# Altium integrated library Weidmueller_OMNIMATE_Power.IntLib: 508 symbols (part 4 of 9)
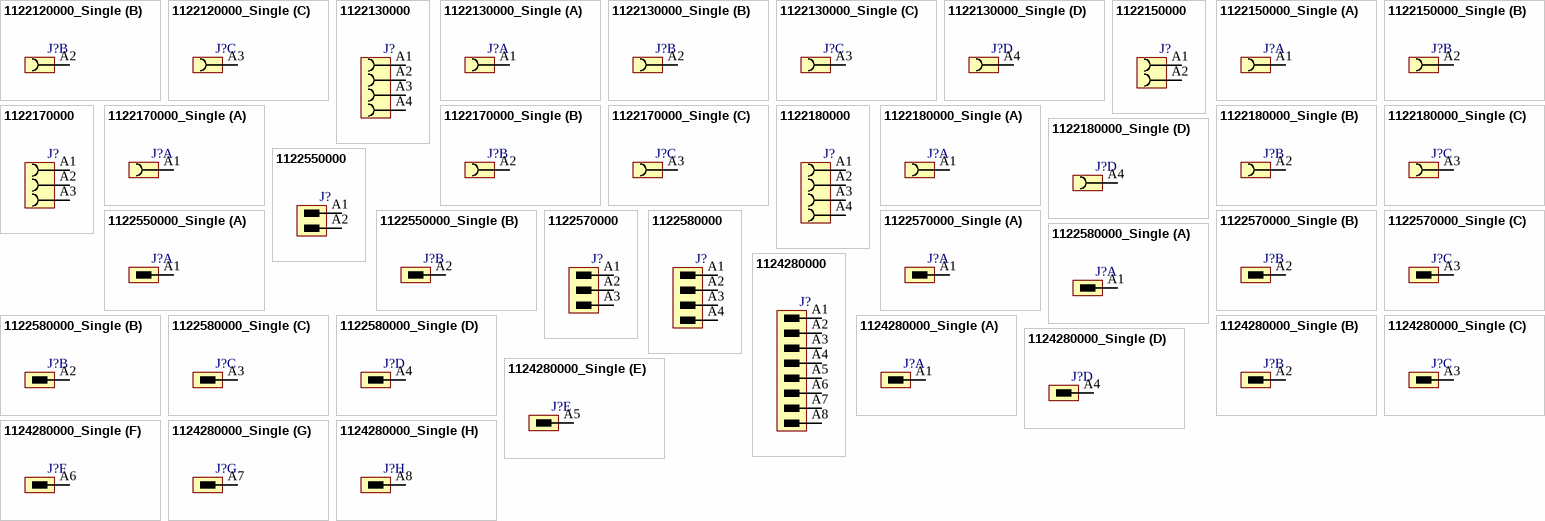
[diagram p34: symbols 1122120000_Single to 1124280000_Single]

## 1122550000
designator J?
OMNIMATE Power - series BL/SL 7.62HP; PartNumber: 1122550000; Manufacturer: Weidmueller; Short_text_for_material: SL 7.62HP/02/180G 3.2SN BK BX; Side_termination_characteristic: closed side; Mounting_onto_the_PCB: Solder connection; Pitch_mm: 7.62 mm; Pitch_inch: 0.3 inch; No_of_poles: 2; Outgoing_elbow: 180°; Solder_pin_length_mm: 3.2 mm; Contact_material: Cu-Leg; Contact_surface: tinned; Insulating_material: PBT; UL_94_flammability_rating: V-0; Rated_voltage_for_surge_voltage_class_pollution_degree_II_2: 630 V; Rated_voltage_use_group_B_UL_1059: 300 V; Rated_current_use_group_B_UL_1059: 20 A; PackageReference: SL_7_62HP_180G_02; Colour: Black; Packaging: Box; Qty: 100 PCS; Revision: V1; ComponentLink1Description: Manufacturer URL; ComponentLink1URL: http://www.weidmueller.com/; ComponentLink2Description: URL Link1; ComponentLink2URL: http://catalog.weidmueller.com/catalog/Start.do?localeId=en&ObjectID=1122550000
footprint SL_7_62HP_180G_02 (OMNIMATE Power - Serie BL/SL 7.62HP  SL 7.62HP/02/180G 3.2)
pins: A1, A2

## 1122550000_Single
designator J?
OMNIMATE Power - series BL/SL 7.62HP; PartNumber: 1122550000; Manufacturer: Weidmueller; Short_text_for_material: SL 7.62HP/02/180G 3.2SN BK BX; Side_termination_characteristic: closed side; Mounting_onto_the_PCB: Solder connection; Pitch_mm: 7.62 mm; Pitch_inch: 0.3 inch; No_of_poles: 2; Outgoing_elbow: 180°; Solder_pin_length_mm: 3.2 mm; Contact_material: Cu-Leg; Contact_surface: tinned; Insulating_material: PBT; UL_94_flammability_rating: V-0; Rated_voltage_for_surge_voltage_class_pollution_degree_II_2: 630 V; Rated_voltage_use_group_B_UL_1059: 300 V; Rated_current_use_group_B_UL_1059: 20 A; PackageReference: SL_7_62HP_180G_02; Colour: Black; Packaging: Box; Qty: 100 PCS; Revision: V1; ComponentLink1Description: Manufacturer URL; ComponentLink1URL: http://www.weidmueller.com/; ComponentLink2Description: URL Link1; ComponentLink2URL: http://catalog.weidmueller.com/catalog/Start.do?localeId=en&ObjectID=1122550000
footprint SL_7_62HP_180G_02 (OMNIMATE Power - Serie BL/SL 7.62HP  SL 7.62HP/02/180G 3.2)
part A pins: A1
part B pins: A2

## 1122570000
designator J?
OMNIMATE Power - series BL/SL 7.62HP; PartNumber: 1122570000; Manufacturer: Weidmueller; Short_text_for_material: SL 7.62HP/03/180G 3.2SN BK BX; Side_termination_characteristic: closed side; Mounting_onto_the_PCB: Solder connection; Pitch_mm: 7.62 mm; Pitch_inch: 0.3 inch; No_of_poles: 3; Outgoing_elbow: 180°; Solder_pin_length_mm: 3.2 mm; Contact_material: Cu-Leg; Contact_surface: tinned; Insulating_material: PBT; UL_94_flammability_rating: V-0; Rated_voltage_for_surge_voltage_class_pollution_degree_II_2: 630 V; Rated_voltage_use_group_B_UL_1059: 300 V; Rated_current_use_group_B_UL_1059: 20 A; PackageReference: SL_7_62HP_180G_03; Colour: Black; Packaging: Box; Qty: 100 PCS; Revision: V1; ComponentLink1Description: Manufacturer URL; ComponentLink1URL: http://www.weidmueller.com/; ComponentLink2Description: URL Link1; ComponentLink2URL: http://catalog.weidmueller.com/catalog/Start.do?localeId=en&ObjectID=1122570000
footprint SL_7_62HP_180G_03 (OMNIMATE Power - Serie BL/SL 7.62HP  SL 7.62HP/03/180G 3.2)
pins: A1, A2, A3

## 1122570000_Single
designator J?
OMNIMATE Power - series BL/SL 7.62HP; PartNumber: 1122570000; Manufacturer: Weidmueller; Short_text_for_material: SL 7.62HP/03/180G 3.2SN BK BX; Side_termination_characteristic: closed side; Mounting_onto_the_PCB: Solder connection; Pitch_mm: 7.62 mm; Pitch_inch: 0.3 inch; No_of_poles: 3; Outgoing_elbow: 180°; Solder_pin_length_mm: 3.2 mm; Contact_material: Cu-Leg; Contact_surface: tinned; Insulating_material: PBT; UL_94_flammability_rating: V-0; Rated_voltage_for_surge_voltage_class_pollution_degree_II_2: 630 V; Rated_voltage_use_group_B_UL_1059: 300 V; Rated_current_use_group_B_UL_1059: 20 A; PackageReference: SL_7_62HP_180G_03; Colour: Black; Packaging: Box; Qty: 100 PCS; Revision: V1; ComponentLink1Description: Manufacturer URL; ComponentLink1URL: http://www.weidmueller.com/; ComponentLink2Description: URL Link1; ComponentLink2URL: http://catalog.weidmueller.com/catalog/Start.do?localeId=en&ObjectID=1122570000
footprint SL_7_62HP_180G_03 (OMNIMATE Power - Serie BL/SL 7.62HP  SL 7.62HP/03/180G 3.2)
part A pins: A1
part B pins: A2
part C pins: A3

## 1122580000
designator J?
OMNIMATE Power - series BL/SL 7.62HP; PartNumber: 1122580000; Manufacturer: Weidmueller; Short_text_for_material: SL 7.62HP/04/180G 3.2SN BK BX; Side_termination_characteristic: closed side; Mounting_onto_the_PCB: Solder connection; Pitch_mm: 7.62 mm; Pitch_inch: 0.3 inch; No_of_poles: 4; Outgoing_elbow: 180°; Solder_pin_length_mm: 3.2 mm; Contact_material: Cu-Leg; Contact_surface: tinned; Insulating_material: PBT; UL_94_flammability_rating: V-0; Rated_voltage_for_surge_voltage_class_pollution_degree_II_2: 630 V; Rated_voltage_use_group_B_UL_1059: 300 V; Rated_current_use_group_B_UL_1059: 20 A; PackageReference: SL_7_62HP_180G_04; Colour: Black; Packaging: Box; Qty: 100 PCS; Revision: V1; ComponentLink1Description: Manufacturer URL; ComponentLink1URL: http://www.weidmueller.com/; ComponentLink2Description: URL Link1; ComponentLink2URL: http://catalog.weidmueller.com/catalog/Start.do?localeId=en&ObjectID=1122580000
footprint SL_7_62HP_180G_04 (OMNIMATE Power - Serie BL/SL 7.62HP  SL 7.62HP/04/180G 3.2)
pins: A1, A2, A3, A4

## 1122580000_Single
designator J?
OMNIMATE Power - series BL/SL 7.62HP; PartNumber: 1122580000; Manufacturer: Weidmueller; Short_text_for_material: SL 7.62HP/04/180G 3.2SN BK BX; Side_termination_characteristic: closed side; Mounting_onto_the_PCB: Solder connection; Pitch_mm: 7.62 mm; Pitch_inch: 0.3 inch; No_of_poles: 4; Outgoing_elbow: 180°; Solder_pin_length_mm: 3.2 mm; Contact_material: Cu-Leg; Contact_surface: tinned; Insulating_material: PBT; UL_94_flammability_rating: V-0; Rated_voltage_for_surge_voltage_class_pollution_degree_II_2: 630 V; Rated_voltage_use_group_B_UL_1059: 300 V; Rated_current_use_group_B_UL_1059: 20 A; PackageReference: SL_7_62HP_180G_04; Colour: Black; Packaging: Box; Qty: 100 PCS; Revision: V1; ComponentLink1Description: Manufacturer URL; ComponentLink1URL: http://www.weidmueller.com/; ComponentLink2Description: URL Link1; ComponentLink2URL: http://catalog.weidmueller.com/catalog/Start.do?localeId=en&ObjectID=1122580000
footprint SL_7_62HP_180G_04 (OMNIMATE Power - Serie BL/SL 7.62HP  SL 7.62HP/04/180G 3.2)
part A pins: A1
part B pins: A2
part C pins: A3
part D pins: A4

## 1124280000
designator J?
OMNIMATE Power - series BL/SL 7.62HP; PartNumber: 1124280000; Manufacturer: Weidmueller; Short_text_for_material: SL 7.62HP/08/90F 3.2 SN BK BX; Side_termination_characteristic: Flange; Mounting_onto_the_PCB: Solder connection; Pitch_mm: 7.62 mm; Pitch_inch: 0.3 inch; No_of_poles: 8; Outgoing_elbow: 90°; Solder_pin_length_mm: 3.2 mm; Contact_material: Cu-Leg; Contact_surface: tinned; Insulating_material: PBT; UL_94_flammability_rating: V-0; Rated_voltage_for_surge_voltage_class_pollution_degree_II_2: 630 V; Rated_voltage_use_group_B_UL_1059: 300 V; Rated_current_use_group_B_UL_1059: 20 A; PackageReference: SL_7_62HP_90F_08; Colour: Black; Packaging: Box; Qty: 50 PCS; Revision: V1; ComponentLink1Description: Manufacturer URL; ComponentLink1URL: http://www.weidmueller.com/; ComponentLink2Description: URL Link1; ComponentLink2URL: http://catalog.weidmueller.com/catalog/Start.do?localeId=en&ObjectID=1124280000
footprint SL_7_62HP_90F_08 (OMNIMATE Power - Serie BL/SL 7.62HP  SL 7.62HP/08/90F 3.2)
pins: A1, A2, A3, A4, A5, A6, A7, A8

## 1124280000_Single
designator J?
OMNIMATE Power - series BL/SL 7.62HP; PartNumber: 1124280000; Manufacturer: Weidmueller; Short_text_for_material: SL 7.62HP/08/90F 3.2 SN BK BX; Side_termination_characteristic: Flange; Mounting_onto_the_PCB: Solder connection; Pitch_mm: 7.62 mm; Pitch_inch: 0.3 inch; No_of_poles: 8; Outgoing_elbow: 90°; Solder_pin_length_mm: 3.2 mm; Contact_material: Cu-Leg; Contact_surface: tinned; Insulating_material: PBT; UL_94_flammability_rating: V-0; Rated_voltage_for_surge_voltage_class_pollution_degree_II_2: 630 V; Rated_voltage_use_group_B_UL_1059: 300 V; Rated_current_use_group_B_UL_1059: 20 A; PackageReference: SL_7_62HP_90F_08; Colour: Black; Packaging: Box; Qty: 50 PCS; Revision: V1; ComponentLink1Description: Manufacturer URL; ComponentLink1URL: http://www.weidmueller.com/; ComponentLink2Description: URL Link1; ComponentLink2URL: http://catalog.weidmueller.com/catalog/Start.do?localeId=en&ObjectID=1124280000
footprint SL_7_62HP_90F_08 (OMNIMATE Power - Serie BL/SL 7.62HP  SL 7.62HP/08/90F 3.2)
part A pins: A1
part B pins: A2
part C pins: A3
part D pins: A4
part E pins: A5
part F pins: A6
part G pins: A7
part H pins: A8

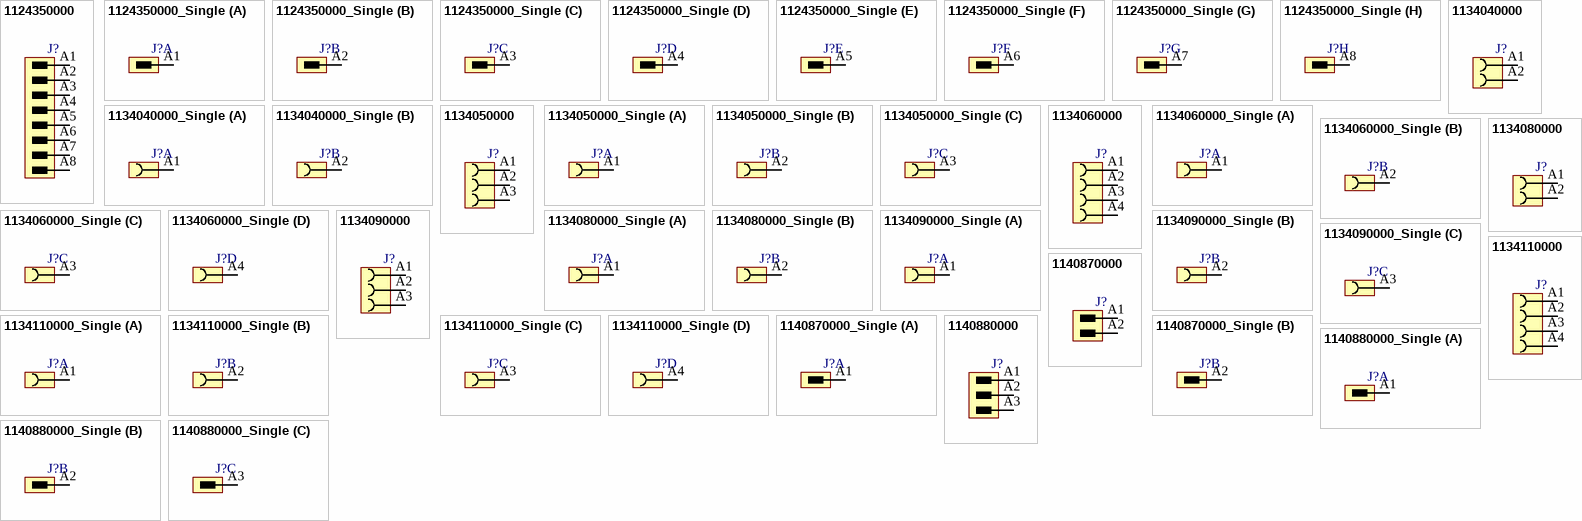
[diagram p11: symbols 1124350000 to 1140880000_Single]

## 1124350000
designator J?
OMNIMATE Power - series BL/SL 7.62HP; PartNumber: 1124350000; Manufacturer: Weidmueller; Short_text_for_material: SL 7.62HP/08/90F 3.2 SN OR BX; Side_termination_characteristic: Flange; Mounting_onto_the_PCB: Solder connection; Pitch_mm: 7.62 mm; Pitch_inch: 0.3 inch; No_of_poles: 8; Outgoing_elbow: 90°; Solder_pin_length_mm: 3.2 mm; Contact_surface: tinned; Insulating_material: PBT; UL_94_flammability_rating: V-0; Rated_voltage_for_surge_voltage_class_pollution_degree_II_2: 630 V; Rated_current_min_no_of_poles_TU_20_deg_C: 29 A; Rated_voltage_use_group_B_UL_1059: 300 V; Rated_current_use_group_B_UL_1059: 20 A; PackageReference: SL_7_62HP_90F_08; Colour: Orange; Packaging: Box; Qty: 50 PCS; Revision: V1; ComponentLink1Description: Manufacturer URL; ComponentLink1URL: http://www.weidmueller.com/; ComponentLink2Description: URL Link1; ComponentLink2URL: http://catalog.weidmueller.com/catalog/Start.do?localeId=en&ObjectID=1124350000
footprint SL_7_62HP_90F_08 (OMNIMATE Power - Serie BL/SL 7.62HP  SL 7.62HP/08/90F 3.2)
pins: A1, A2, A3, A4, A5, A6, A7, A8

## 1124350000_Single
designator J?
OMNIMATE Power - series BL/SL 7.62HP; PartNumber: 1124350000; Manufacturer: Weidmueller; Short_text_for_material: SL 7.62HP/08/90F 3.2 SN OR BX; Side_termination_characteristic: Flange; Mounting_onto_the_PCB: Solder connection; Pitch_mm: 7.62 mm; Pitch_inch: 0.3 inch; No_of_poles: 8; Outgoing_elbow: 90°; Solder_pin_length_mm: 3.2 mm; Contact_surface: tinned; Insulating_material: PBT; UL_94_flammability_rating: V-0; Rated_voltage_for_surge_voltage_class_pollution_degree_II_2: 630 V; Rated_current_min_no_of_poles_TU_20_deg_C: 29 A; Rated_voltage_use_group_B_UL_1059: 300 V; Rated_current_use_group_B_UL_1059: 20 A; PackageReference: SL_7_62HP_90F_08; Colour: Orange; Packaging: Box; Qty: 50 PCS; Revision: V1; ComponentLink1Description: Manufacturer URL; ComponentLink1URL: http://www.weidmueller.com/; ComponentLink2Description: URL Link1; ComponentLink2URL: http://catalog.weidmueller.com/catalog/Start.do?localeId=en&ObjectID=1124350000
footprint SL_7_62HP_90F_08 (OMNIMATE Power - Serie BL/SL 7.62HP  SL 7.62HP/08/90F 3.2)
part A pins: A1
part B pins: A2
part C pins: A3
part D pins: A4
part E pins: A5
part F pins: A6
part G pins: A7
part H pins: A8

## 1134040000
designator J?
OMNIMATE Power - series BL/SL 7.62HP; PartNumber: 1134040000; Manufacturer: Weidmueller; Short_text_for_material: BLL 7.62HP/02/180LF SN OR BX; Side_termination_characteristic: Solder flange; Mounting_onto_the_PCB: Solder connection; Pitch_mm: 7.62 mm; Pitch_inch: 0.3 inch; No_of_poles: 2; Outgoing_elbow: 180°; Solder_pin_length_mm: 3.2 mm; Contact_surface: tinned; Insulating_material: PA GF; UL_94_flammability_rating: V-0; Rated_voltage_for_surge_voltage_class_pollution_degree_II_2: 630 V; Rated_current_min_no_of_poles_TU_20_deg_C: 24 A; Rated_voltage_use_group_B_UL_1059: 300 V; Rated_current_use_group_B_UL_1059: 20 A; PackageReference: BLL_7_62HP_180LF_02; Colour: Orange; Packaging: Box; Qty: 72 PCS; Revision: V1; ComponentLink1Description: Manufacturer URL; ComponentLink1URL: http://www.weidmueller.com/; ComponentLink2Description: URL Link1; ComponentLink2URL: http://catalog.weidmueller.com/catalog/Start.do?localeId=en&ObjectID=1134040000
footprint BLL_7_62HP_180LF_02 (OMNIMATE Power - Serie BL/SL 7.62HP  BLL 7.62HP/02/180)
pins: A1, A2

## 1134040000_Single
designator J?
OMNIMATE Power - series BL/SL 7.62HP; PartNumber: 1134040000; Manufacturer: Weidmueller; Short_text_for_material: BLL 7.62HP/02/180LF SN OR BX; Side_termination_characteristic: Solder flange; Mounting_onto_the_PCB: Solder connection; Pitch_mm: 7.62 mm; Pitch_inch: 0.3 inch; No_of_poles: 2; Outgoing_elbow: 180°; Solder_pin_length_mm: 3.2 mm; Contact_surface: tinned; Insulating_material: PA GF; UL_94_flammability_rating: V-0; Rated_voltage_for_surge_voltage_class_pollution_degree_II_2: 630 V; Rated_current_min_no_of_poles_TU_20_deg_C: 24 A; Rated_voltage_use_group_B_UL_1059: 300 V; Rated_current_use_group_B_UL_1059: 20 A; PackageReference: BLL_7_62HP_180LF_02; Colour: Orange; Packaging: Box; Qty: 72 PCS; Revision: V1; ComponentLink1Description: Manufacturer URL; ComponentLink1URL: http://www.weidmueller.com/; ComponentLink2Description: URL Link1; ComponentLink2URL: http://catalog.weidmueller.com/catalog/Start.do?localeId=en&ObjectID=1134040000
footprint BLL_7_62HP_180LF_02 (OMNIMATE Power - Serie BL/SL 7.62HP  BLL 7.62HP/02/180)
part A pins: A1
part B pins: A2

## 1134050000
designator J?
OMNIMATE Power - series BL/SL 7.62HP; PartNumber: 1134050000; Manufacturer: Weidmueller; Short_text_for_material: BLL 7.62HP/03/180LF SN OR BX; Side_termination_characteristic: Solder flange; Mounting_onto_the_PCB: Solder connection; Pitch_mm: 7.62 mm; Pitch_inch: 0.3 inch; No_of_poles: 3; Outgoing_elbow: 180°; Solder_pin_length_mm: 3.2 mm; Contact_surface: tinned; Insulating_material: PA GF; UL_94_flammability_rating: V-0; Rated_voltage_for_surge_voltage_class_pollution_degree_II_2: 630 V; Rated_current_min_no_of_poles_TU_20_deg_C: 24 A; Rated_voltage_use_group_B_UL_1059: 300 V; Rated_current_use_group_B_UL_1059: 20 A; PackageReference: BLL_7_62HP_180LF_03; Colour: Orange; Packaging: Box; Qty: 54 PCS; Revision: V1; ComponentLink1Description: Manufacturer URL; ComponentLink1URL: http://www.weidmueller.com/; ComponentLink2Description: URL Link1; ComponentLink2URL: http://catalog.weidmueller.com/catalog/Start.do?localeId=en&ObjectID=1134050000
footprint BLL_7_62HP_180LF_03 (OMNIMATE Power - Serie BL/SL 7.62HP  BLL 7.62HP/03/180)
pins: A1, A2, A3

## 1134050000_Single
designator J?
OMNIMATE Power - series BL/SL 7.62HP; PartNumber: 1134050000; Manufacturer: Weidmueller; Short_text_for_material: BLL 7.62HP/03/180LF SN OR BX; Side_termination_characteristic: Solder flange; Mounting_onto_the_PCB: Solder connection; Pitch_mm: 7.62 mm; Pitch_inch: 0.3 inch; No_of_poles: 3; Outgoing_elbow: 180°; Solder_pin_length_mm: 3.2 mm; Contact_surface: tinned; Insulating_material: PA GF; UL_94_flammability_rating: V-0; Rated_voltage_for_surge_voltage_class_pollution_degree_II_2: 630 V; Rated_current_min_no_of_poles_TU_20_deg_C: 24 A; Rated_voltage_use_group_B_UL_1059: 300 V; Rated_current_use_group_B_UL_1059: 20 A; PackageReference: BLL_7_62HP_180LF_03; Colour: Orange; Packaging: Box; Qty: 54 PCS; Revision: V1; ComponentLink1Description: Manufacturer URL; ComponentLink1URL: http://www.weidmueller.com/; ComponentLink2Description: URL Link1; ComponentLink2URL: http://catalog.weidmueller.com/catalog/Start.do?localeId=en&ObjectID=1134050000
footprint BLL_7_62HP_180LF_03 (OMNIMATE Power - Serie BL/SL 7.62HP  BLL 7.62HP/03/180)
part A pins: A1
part B pins: A2
part C pins: A3

## 1134060000
designator J?
OMNIMATE Power - series BL/SL 7.62HP; PartNumber: 1134060000; Manufacturer: Weidmueller; Short_text_for_material: BLL 7.62HP/04/180LF SN OR BX; Side_termination_characteristic: Solder flange; Mounting_onto_the_PCB: Solder connection; Pitch_mm: 7.62 mm; Pitch_inch: 0.3 inch; No_of_poles: 4; Outgoing_elbow: 180°; Solder_pin_length_mm: 3.2 mm; Contact_surface: tinned; Insulating_material: PA GF; UL_94_flammability_rating: V-0; Rated_voltage_for_surge_voltage_class_pollution_degree_II_2: 630 V; Rated_current_min_no_of_poles_TU_20_deg_C: 24 A; Rated_voltage_use_group_B_UL_1059: 300 V; Rated_current_use_group_B_UL_1059: 20 A; PackageReference: BLL_7_62HP_180LF_04; Colour: Orange; Packaging: Box; Qty: 42 PCS; Revision: V1; ComponentLink1Description: Manufacturer URL; ComponentLink1URL: http://www.weidmueller.com/; ComponentLink2Description: URL Link1; ComponentLink2URL: http://catalog.weidmueller.com/catalog/Start.do?localeId=en&ObjectID=1134060000
footprint BLL_7_62HP_180LF_04 (OMNIMATE Power - Serie BL/SL 7.62HP  BLL 7.62HP/04/180)
pins: A1, A2, A3, A4

## 1134060000_Single
designator J?
OMNIMATE Power - series BL/SL 7.62HP; PartNumber: 1134060000; Manufacturer: Weidmueller; Short_text_for_material: BLL 7.62HP/04/180LF SN OR BX; Side_termination_characteristic: Solder flange; Mounting_onto_the_PCB: Solder connection; Pitch_mm: 7.62 mm; Pitch_inch: 0.3 inch; No_of_poles: 4; Outgoing_elbow: 180°; Solder_pin_length_mm: 3.2 mm; Contact_surface: tinned; Insulating_material: PA GF; UL_94_flammability_rating: V-0; Rated_voltage_for_surge_voltage_class_pollution_degree_II_2: 630 V; Rated_current_min_no_of_poles_TU_20_deg_C: 24 A; Rated_voltage_use_group_B_UL_1059: 300 V; Rated_current_use_group_B_UL_1059: 20 A; PackageReference: BLL_7_62HP_180LF_04; Colour: Orange; Packaging: Box; Qty: 42 PCS; Revision: V1; ComponentLink1Description: Manufacturer URL; ComponentLink1URL: http://www.weidmueller.com/; ComponentLink2Description: URL Link1; ComponentLink2URL: http://catalog.weidmueller.com/catalog/Start.do?localeId=en&ObjectID=1134060000
footprint BLL_7_62HP_180LF_04 (OMNIMATE Power - Serie BL/SL 7.62HP  BLL 7.62HP/04/180)
part A pins: A1
part B pins: A2
part C pins: A3
part D pins: A4

## 1134080000
designator J?
OMNIMATE Power - series BL/SL 7.62HP; PartNumber: 1134080000; Manufacturer: Weidmueller; Short_text_for_material: BLL 7.62HP/02/180LF SN BK BX; Side_termination_characteristic: Solder flange; Pitch_mm: 7.62 mm; Pitch_inch: 0.3 inch; No_of_poles: 2; Outgoing_elbow: 180°; Solder_pin_length_mm: 3.2 mm; Contact_material: Cu-Leg; Contact_surface: tinned; Insulating_material: PA GF; UL_94_flammability_rating: V-0; Rated_voltage_for_surge_voltage_class_pollution_degree_II_2: 630 V; Rated_voltage_use_group_B_UL_1059: 300 V; Rated_current_use_group_B_UL_1059: 20 A; PackageReference: BLL_7_62HP_180LF_02; Colour: Black; Packaging: Box; Qty: 72 PCS; Revision: V1; ComponentLink1Description: Manufacturer URL; ComponentLink1URL: http://www.weidmueller.com/; ComponentLink2Description: URL Link1; ComponentLink2URL: http://catalog.weidmueller.com/catalog/Start.do?localeId=en&ObjectID=1134080000
footprint BLL_7_62HP_180LF_02 (OMNIMATE Power - Serie BL/SL 7.62HP  BLL 7.62HP/02/180)
pins: A1, A2

## 1134080000_Single
designator J?
OMNIMATE Power - series BL/SL 7.62HP; PartNumber: 1134080000; Manufacturer: Weidmueller; Short_text_for_material: BLL 7.62HP/02/180LF SN BK BX; Side_termination_characteristic: Solder flange; Pitch_mm: 7.62 mm; Pitch_inch: 0.3 inch; No_of_poles: 2; Outgoing_elbow: 180°; Solder_pin_length_mm: 3.2 mm; Contact_material: Cu-Leg; Contact_surface: tinned; Insulating_material: PA GF; UL_94_flammability_rating: V-0; Rated_voltage_for_surge_voltage_class_pollution_degree_II_2: 630 V; Rated_voltage_use_group_B_UL_1059: 300 V; Rated_current_use_group_B_UL_1059: 20 A; PackageReference: BLL_7_62HP_180LF_02; Colour: Black; Packaging: Box; Qty: 72 PCS; Revision: V1; ComponentLink1Description: Manufacturer URL; ComponentLink1URL: http://www.weidmueller.com/; ComponentLink2Description: URL Link1; ComponentLink2URL: http://catalog.weidmueller.com/catalog/Start.do?localeId=en&ObjectID=1134080000
footprint BLL_7_62HP_180LF_02 (OMNIMATE Power - Serie BL/SL 7.62HP  BLL 7.62HP/02/180)
part A pins: A1
part B pins: A2

## 1134090000
designator J?
OMNIMATE Power - series BL/SL 7.62HP; PartNumber: 1134090000; Manufacturer: Weidmueller; Short_text_for_material: BLL 7.62HP/03/180LF SN BK BX; Side_termination_characteristic: Solder flange; Pitch_mm: 7.62 mm; Pitch_inch: 0.3 inch; No_of_poles: 3; Outgoing_elbow: 180°; Solder_pin_length_mm: 3.2 mm; Contact_material: Cu-Leg; Contact_surface: tinned; Insulating_material: PA GF; UL_94_flammability_rating: V-0; Rated_voltage_for_surge_voltage_class_pollution_degree_II_2: 630 V; Rated_voltage_use_group_B_UL_1059: 300 V; Rated_current_use_group_B_UL_1059: 20 A; PackageReference: BLL_7_62HP_180LF_03; Colour: Black; Packaging: Box; Qty: 54 PCS; Revision: V1; ComponentLink1Description: Manufacturer URL; ComponentLink1URL: http://www.weidmueller.com/; ComponentLink2Description: URL Link1; ComponentLink2URL: http://catalog.weidmueller.com/catalog/Start.do?localeId=en&ObjectID=1134090000
footprint BLL_7_62HP_180LF_03 (OMNIMATE Power - Serie BL/SL 7.62HP  BLL 7.62HP/03/180)
pins: A1, A2, A3

## 1134090000_Single
designator J?
OMNIMATE Power - series BL/SL 7.62HP; PartNumber: 1134090000; Manufacturer: Weidmueller; Short_text_for_material: BLL 7.62HP/03/180LF SN BK BX; Side_termination_characteristic: Solder flange; Pitch_mm: 7.62 mm; Pitch_inch: 0.3 inch; No_of_poles: 3; Outgoing_elbow: 180°; Solder_pin_length_mm: 3.2 mm; Contact_material: Cu-Leg; Contact_surface: tinned; Insulating_material: PA GF; UL_94_flammability_rating: V-0; Rated_voltage_for_surge_voltage_class_pollution_degree_II_2: 630 V; Rated_voltage_use_group_B_UL_1059: 300 V; Rated_current_use_group_B_UL_1059: 20 A; PackageReference: BLL_7_62HP_180LF_03; Colour: Black; Packaging: Box; Qty: 54 PCS; Revision: V1; ComponentLink1Description: Manufacturer URL; ComponentLink1URL: http://www.weidmueller.com/; ComponentLink2Description: URL Link1; ComponentLink2URL: http://catalog.weidmueller.com/catalog/Start.do?localeId=en&ObjectID=1134090000
footprint BLL_7_62HP_180LF_03 (OMNIMATE Power - Serie BL/SL 7.62HP  BLL 7.62HP/03/180)
part A pins: A1
part B pins: A2
part C pins: A3

## 1134110000
designator J?
OMNIMATE Power - series BL/SL 7.62HP; PartNumber: 1134110000; Manufacturer: Weidmueller; Short_text_for_material: BLL 7.62HP/04/180LF SN BK BX; Side_termination_characteristic: Solder flange; Pitch_mm: 7.62 mm; Pitch_inch: 0.3 inch; No_of_poles: 4; Outgoing_elbow: 180°; Solder_pin_length_mm: 3.2 mm; Contact_material: Cu-Leg; Contact_surface: tinned; Insulating_material: PA GF; UL_94_flammability_rating: V-0; Rated_voltage_for_surge_voltage_class_pollution_degree_II_2: 630 V; Rated_voltage_use_group_B_UL_1059: 300 V; Rated_current_use_group_B_UL_1059: 20 A; PackageReference: BLL_7_62HP_180LF_04; Colour: Black; Packaging: Box; Qty: 42 PCS; Revision: V1; ComponentLink1Description: Manufacturer URL; ComponentLink1URL: http://www.weidmueller.com/; ComponentLink2Description: URL Link1; ComponentLink2URL: http://catalog.weidmueller.com/catalog/Start.do?localeId=en&ObjectID=1134110000
footprint BLL_7_62HP_180LF_04 (OMNIMATE Power - Serie BL/SL 7.62HP  BLL 7.62HP/04/180)
pins: A1, A2, A3, A4

## 1134110000_Single
designator J?
OMNIMATE Power - series BL/SL 7.62HP; PartNumber: 1134110000; Manufacturer: Weidmueller; Short_text_for_material: BLL 7.62HP/04/180LF SN BK BX; Side_termination_characteristic: Solder flange; Pitch_mm: 7.62 mm; Pitch_inch: 0.3 inch; No_of_poles: 4; Outgoing_elbow: 180°; Solder_pin_length_mm: 3.2 mm; Contact_material: Cu-Leg; Contact_surface: tinned; Insulating_material: PA GF; UL_94_flammability_rating: V-0; Rated_voltage_for_surge_voltage_class_pollution_degree_II_2: 630 V; Rated_voltage_use_group_B_UL_1059: 300 V; Rated_current_use_group_B_UL_1059: 20 A; PackageReference: BLL_7_62HP_180LF_04; Colour: Black; Packaging: Box; Qty: 42 PCS; Revision: V1; ComponentLink1Description: Manufacturer URL; ComponentLink1URL: http://www.weidmueller.com/; ComponentLink2Description: URL Link1; ComponentLink2URL: http://catalog.weidmueller.com/catalog/Start.do?localeId=en&ObjectID=1134110000
footprint BLL_7_62HP_180LF_04 (OMNIMATE Power - Serie BL/SL 7.62HP  BLL 7.62HP/04/180)
part A pins: A1
part B pins: A2
part C pins: A3
part D pins: A4

## 1140870000
designator J?
OMNIMATE Power - series BL/SL 7.62HP; PartNumber: 1140870000; Manufacturer: Weidmueller; Short_text_for_material: SL 7.62HP/02/180F 3.2 SN BK BX; Side_termination_characteristic: Flange; Mounting_onto_the_PCB: Solder connection; Pitch_mm: 7.62 mm; Pitch_inch: 0.3 inch; No_of_poles: 2; Outgoing_elbow: 180°; Solder_pin_length_mm: 3.2 mm; Contact_material: Cu-Leg; Contact_surface: tinned; Insulating_material: PBT; UL_94_flammability_rating: V-0; Rated_voltage_for_surge_voltage_class_pollution_degree_II_2: 630 V; Rated_voltage_use_group_B_UL_1059: 300 V; Rated_current_use_group_B_UL_1059: 20 A; PackageReference: SL_7_62HP_180F_02; Colour: Black; Packaging: Box; Qty: 100 PCS; Revision: V1; ComponentLink1Description: Manufacturer URL; ComponentLink1URL: http://www.weidmueller.com/; ComponentLink2Description: URL Link1; ComponentLink2URL: http://catalog.weidmueller.com/catalog/Start.do?localeId=en&ObjectID=1140870000
footprint SL_7_62HP_180F_02 (OMNIMATE Power - Serie BL/SL 7.62HP  SL 7.62HP/02/180F 3.2)
pins: A1, A2

## 1140870000_Single
designator J?
OMNIMATE Power - series BL/SL 7.62HP; PartNumber: 1140870000; Manufacturer: Weidmueller; Short_text_for_material: SL 7.62HP/02/180F 3.2 SN BK BX; Side_termination_characteristic: Flange; Mounting_onto_the_PCB: Solder connection; Pitch_mm: 7.62 mm; Pitch_inch: 0.3 inch; No_of_poles: 2; Outgoing_elbow: 180°; Solder_pin_length_mm: 3.2 mm; Contact_material: Cu-Leg; Contact_surface: tinned; Insulating_material: PBT; UL_94_flammability_rating: V-0; Rated_voltage_for_surge_voltage_class_pollution_degree_II_2: 630 V; Rated_voltage_use_group_B_UL_1059: 300 V; Rated_current_use_group_B_UL_1059: 20 A; PackageReference: SL_7_62HP_180F_02; Colour: Black; Packaging: Box; Qty: 100 PCS; Revision: V1; ComponentLink1Description: Manufacturer URL; ComponentLink1URL: http://www.weidmueller.com/; ComponentLink2Description: URL Link1; ComponentLink2URL: http://catalog.weidmueller.com/catalog/Start.do?localeId=en&ObjectID=1140870000
footprint SL_7_62HP_180F_02 (OMNIMATE Power - Serie BL/SL 7.62HP  SL 7.62HP/02/180F 3.2)
part A pins: A1
part B pins: A2

## 1140880000
designator J?
OMNIMATE Power - series BL/SL 7.62HP; PartNumber: 1140880000; Manufacturer: Weidmueller; Short_text_for_material: SL 7.62HP/03/180F 3.2 SN BK BX; Side_termination_characteristic: Flange; Mounting_onto_the_PCB: Solder connection; Pitch_mm: 7.62 mm; Pitch_inch: 0.3 inch; No_of_poles: 3; Outgoing_elbow: 180°; Solder_pin_length_mm: 3.2 mm; Contact_material: Cu-Leg; Contact_surface: tinned; Insulating_material: PBT; UL_94_flammability_rating: V-0; Rated_voltage_for_surge_voltage_class_pollution_degree_II_2: 630 V; Rated_voltage_use_group_B_UL_1059: 300 V; Rated_current_use_group_B_UL_1059: 20 A; PackageReference: SL_7_62HP_180F_03; Colour: Black; Packaging: Box; Qty: 100 PCS; Revision: V1; ComponentLink1Description: Manufacturer URL; ComponentLink1URL: http://www.weidmueller.com/; ComponentLink2Description: URL Link1; ComponentLink2URL: http://catalog.weidmueller.com/catalog/Start.do?localeId=en&ObjectID=1140880000
footprint SL_7_62HP_180F_03 (OMNIMATE Power - Serie BL/SL 7.62HP  SL 7.62HP/03/180F 3.2)
pins: A1, A2, A3

## 1140880000_Single
designator J?
OMNIMATE Power - series BL/SL 7.62HP; PartNumber: 1140880000; Manufacturer: Weidmueller; Short_text_for_material: SL 7.62HP/03/180F 3.2 SN BK BX; Side_termination_characteristic: Flange; Mounting_onto_the_PCB: Solder connection; Pitch_mm: 7.62 mm; Pitch_inch: 0.3 inch; No_of_poles: 3; Outgoing_elbow: 180°; Solder_pin_length_mm: 3.2 mm; Contact_material: Cu-Leg; Contact_surface: tinned; Insulating_material: PBT; UL_94_flammability_rating: V-0; Rated_voltage_for_surge_voltage_class_pollution_degree_II_2: 630 V; Rated_voltage_use_group_B_UL_1059: 300 V; Rated_current_use_group_B_UL_1059: 20 A; PackageReference: SL_7_62HP_180F_03; Colour: Black; Packaging: Box; Qty: 100 PCS; Revision: V1; ComponentLink1Description: Manufacturer URL; ComponentLink1URL: http://www.weidmueller.com/; ComponentLink2Description: URL Link1; ComponentLink2URL: http://catalog.weidmueller.com/catalog/Start.do?localeId=en&ObjectID=1140880000
footprint SL_7_62HP_180F_03 (OMNIMATE Power - Serie BL/SL 7.62HP  SL 7.62HP/03/180F 3.2)
part A pins: A1
part B pins: A2
part C pins: A3

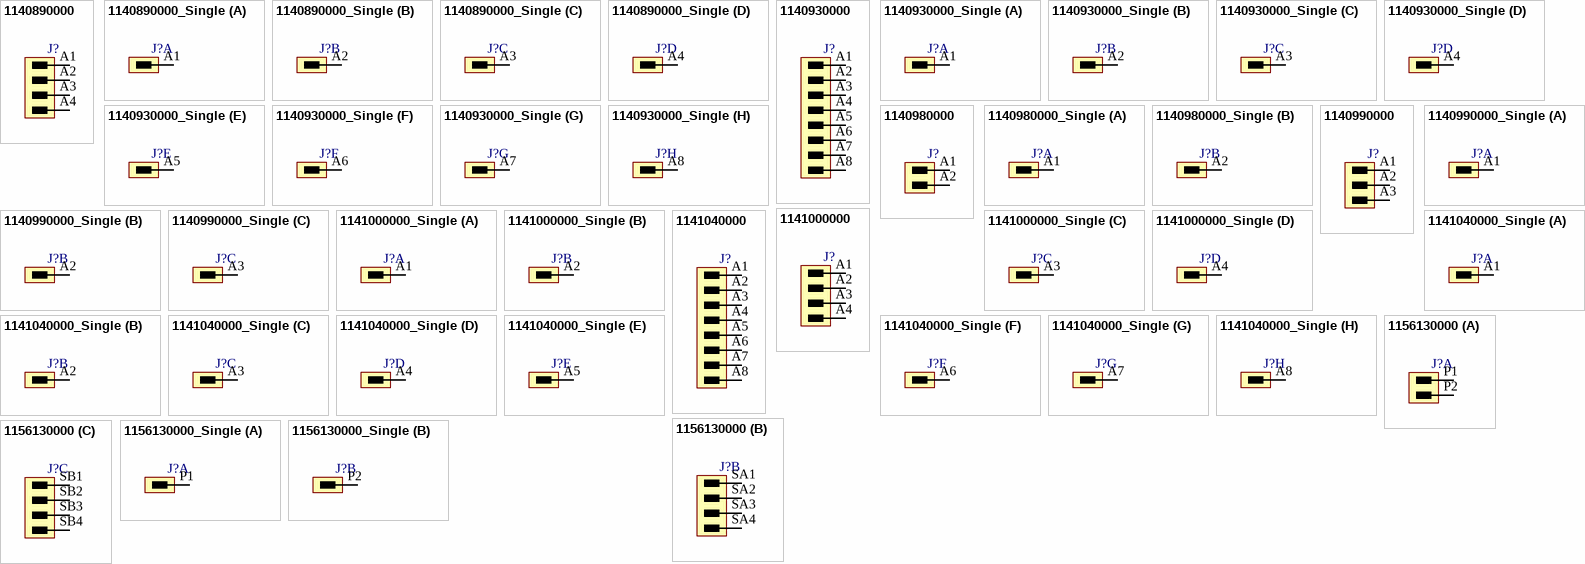
[diagram p12: symbols 1140890000 to 1156130000_Single]

## 1140890000
designator J?
OMNIMATE Power - series BL/SL 7.62HP; PartNumber: 1140890000; Manufacturer: Weidmueller; Short_text_for_material: SL 7.62HP/04/180F 3.2 SN BK BX; Side_termination_characteristic: Flange; Mounting_onto_the_PCB: Solder connection; Pitch_mm: 7.62 mm; Pitch_inch: 0.3 inch; No_of_poles: 4; Outgoing_elbow: 180°; Solder_pin_length_mm: 3.2 mm; Contact_material: Cu-Leg; Contact_surface: tinned; Insulating_material: PBT; UL_94_flammability_rating: V-0; Rated_voltage_for_surge_voltage_class_pollution_degree_II_2: 630 V; Rated_voltage_use_group_B_UL_1059: 300 V; Rated_current_use_group_B_UL_1059: 20 A; PackageReference: SL_7_62HP_180F_04; Colour: Black; Packaging: Box; Qty: 100 PCS; Revision: V1; ComponentLink1Description: Manufacturer URL; ComponentLink1URL: http://www.weidmueller.com/; ComponentLink2Description: URL Link1; ComponentLink2URL: http://catalog.weidmueller.com/catalog/Start.do?localeId=en&ObjectID=1140890000
footprint SL_7_62HP_180F_04 (OMNIMATE Power - Serie BL/SL 7.62HP  SL 7.62HP/04/180F 3.2)
pins: A1, A2, A3, A4

## 1140890000_Single
designator J?
OMNIMATE Power - series BL/SL 7.62HP; PartNumber: 1140890000; Manufacturer: Weidmueller; Short_text_for_material: SL 7.62HP/04/180F 3.2 SN BK BX; Side_termination_characteristic: Flange; Mounting_onto_the_PCB: Solder connection; Pitch_mm: 7.62 mm; Pitch_inch: 0.3 inch; No_of_poles: 4; Outgoing_elbow: 180°; Solder_pin_length_mm: 3.2 mm; Contact_material: Cu-Leg; Contact_surface: tinned; Insulating_material: PBT; UL_94_flammability_rating: V-0; Rated_voltage_for_surge_voltage_class_pollution_degree_II_2: 630 V; Rated_voltage_use_group_B_UL_1059: 300 V; Rated_current_use_group_B_UL_1059: 20 A; PackageReference: SL_7_62HP_180F_04; Colour: Black; Packaging: Box; Qty: 100 PCS; Revision: V1; ComponentLink1Description: Manufacturer URL; ComponentLink1URL: http://www.weidmueller.com/; ComponentLink2Description: URL Link1; ComponentLink2URL: http://catalog.weidmueller.com/catalog/Start.do?localeId=en&ObjectID=1140890000
footprint SL_7_62HP_180F_04 (OMNIMATE Power - Serie BL/SL 7.62HP  SL 7.62HP/04/180F 3.2)
part A pins: A1
part B pins: A2
part C pins: A3
part D pins: A4

## 1140930000
designator J?
OMNIMATE Power - series BL/SL 7.62HP; PartNumber: 1140930000; Manufacturer: Weidmueller; Short_text_for_material: SL 7.62HP/08/180F 3.2 SN BK BX; Side_termination_characteristic: Flange; Mounting_onto_the_PCB: Solder connection; Pitch_mm: 7.62 mm; Pitch_inch: 0.3 inch; No_of_poles: 8; Outgoing_elbow: 180°; Solder_pin_length_mm: 3.2 mm; Contact_material: Cu-Leg; Contact_surface: tinned; Insulating_material: PBT; UL_94_flammability_rating: V-0; Rated_voltage_for_surge_voltage_class_pollution_degree_II_2: 630 V; Rated_voltage_use_group_B_UL_1059: 300 V; Rated_current_use_group_B_UL_1059: 20 A; PackageReference: SL_7_62HP_180F_08; Colour: Black; Packaging: Box; Qty: 50 PCS; Revision: V1; ComponentLink1Description: Manufacturer URL; ComponentLink1URL: http://www.weidmueller.com/; ComponentLink2Description: URL Link1; ComponentLink2URL: http://catalog.weidmueller.com/catalog/Start.do?localeId=en&ObjectID=1140930000
footprint SL_7_62HP_180F_08 (OMNIMATE Power - Serie BL/SL 7.62HP  SL 7.62HP/08/180F 3.2)
pins: A1, A2, A3, A4, A5, A6, A7, A8

## 1140930000_Single
designator J?
OMNIMATE Power - series BL/SL 7.62HP; PartNumber: 1140930000; Manufacturer: Weidmueller; Short_text_for_material: SL 7.62HP/08/180F 3.2 SN BK BX; Side_termination_characteristic: Flange; Mounting_onto_the_PCB: Solder connection; Pitch_mm: 7.62 mm; Pitch_inch: 0.3 inch; No_of_poles: 8; Outgoing_elbow: 180°; Solder_pin_length_mm: 3.2 mm; Contact_material: Cu-Leg; Contact_surface: tinned; Insulating_material: PBT; UL_94_flammability_rating: V-0; Rated_voltage_for_surge_voltage_class_pollution_degree_II_2: 630 V; Rated_voltage_use_group_B_UL_1059: 300 V; Rated_current_use_group_B_UL_1059: 20 A; PackageReference: SL_7_62HP_180F_08; Colour: Black; Packaging: Box; Qty: 50 PCS; Revision: V1; ComponentLink1Description: Manufacturer URL; ComponentLink1URL: http://www.weidmueller.com/; ComponentLink2Description: URL Link1; ComponentLink2URL: http://catalog.weidmueller.com/catalog/Start.do?localeId=en&ObjectID=1140930000
footprint SL_7_62HP_180F_08 (OMNIMATE Power - Serie BL/SL 7.62HP  SL 7.62HP/08/180F 3.2)
part A pins: A1
part B pins: A2
part C pins: A3
part D pins: A4
part E pins: A5
part F pins: A6
part G pins: A7
part H pins: A8

## 1140980000
designator J?
OMNIMATE Power - series BL/SL 7.62HP; PartNumber: 1140980000; Manufacturer: Weidmueller; Short_text_for_material: SL 7.62HP/02/180F 3.2 SN OR BX; Side_termination_characteristic: Flange; Mounting_onto_the_PCB: Solder connection; Pitch_mm: 7.62 mm; Pitch_inch: 0.3 inch; No_of_poles: 2; Outgoing_elbow: 180°; Solder_pin_length_mm: 3.2 mm; Contact_surface: tinned; Insulating_material: PBT; UL_94_flammability_rating: V-0; Rated_voltage_for_surge_voltage_class_pollution_degree_II_2: 630 V; Rated_current_min_no_of_poles_TU_20_deg_C: 29 A; Rated_voltage_use_group_B_UL_1059: 300 V; Rated_current_use_group_B_UL_1059: 20 A; PackageReference: SL_7_62HP_180F_02; Colour: Orange; Packaging: Box; Qty: 100 PCS; Revision: V1; ComponentLink1Description: Manufacturer URL; ComponentLink1URL: http://www.weidmueller.com/; ComponentLink2Description: URL Link1; ComponentLink2URL: http://catalog.weidmueller.com/catalog/Start.do?localeId=en&ObjectID=1140980000
footprint SL_7_62HP_180F_02 (OMNIMATE Power - Serie BL/SL 7.62HP  SL 7.62HP/02/180F 3.2)
pins: A1, A2

## 1140980000_Single
designator J?